# Altium footprint library Lib_001.PcbLib: 429 footprints (part 7 of 28)
Each footprint in its own frame and in the unit in brackets; x right, y up, seen from the top. Pads: shape width x height; smd on the part's side, far side on the other; paste and mask are expansions set on the pad; w line width, h text height; cw(c..) or ccw(c..) is an arc to the next point about the centre after c.
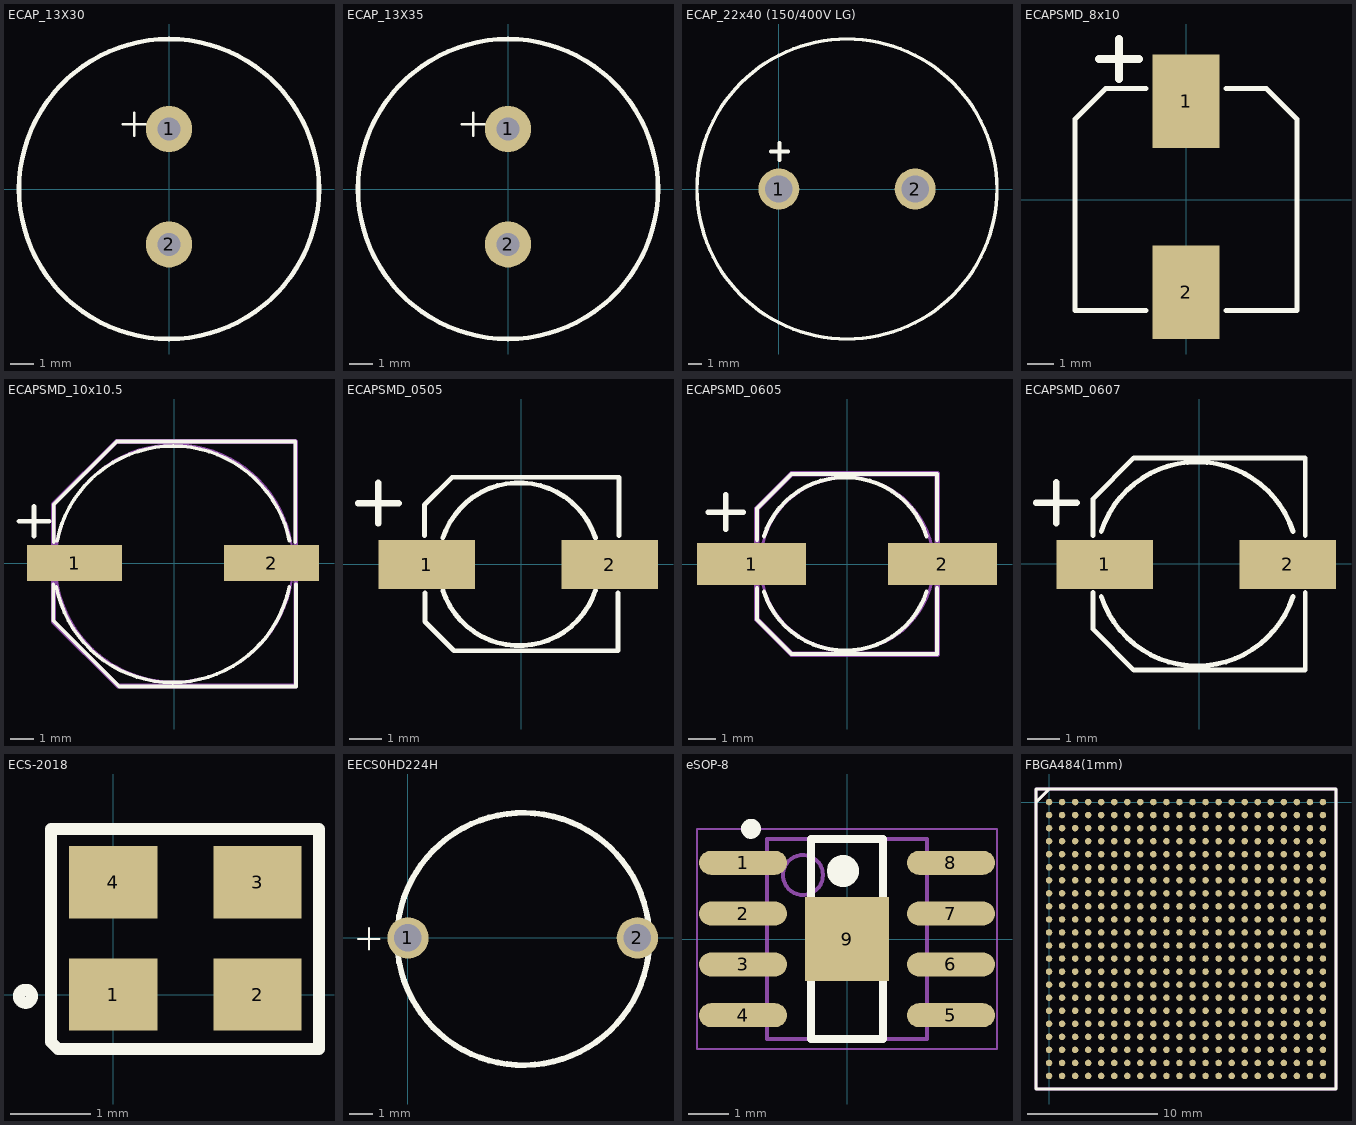
[diagram p6: the footprints below, top view; thin cyan lines are the x and y axes]

## ECAP_13X30 [mm]
height 11
pads (2):
  round 2 hole 1: 1(0,2.6) 2(0,-2.4)
Top Overlay:
  circle w0.2: c0,0 r6.5
  lines w0.1: -2,2.8 -1,2.8 ; -1.5,2.3 -1.5,3.3
3D body "User Library-Cap electrolitic radial 13x31.STEP": height 31.8, standoff -0.7, extent -6.482,-6.438 6.499,6.558

## ECAP_13X35 [mm]
height 11
pads (2):
  round 2 hole 1: 1(0,2.6) 2(0,-2.4)
Top Overlay:
  circle w0.2: c0,0 r6.5
  lines w0.1: -2,2.8 -1,2.8 ; -1.5,2.3 -1.5,3.3
3D body "User Library-Cap electrolitic radial 13x35.STEP": height 35.8, standoff -0.7, extent -6.481,-6.498 6.5,6.498

## ECAP_22x40 (150/400V LG) [mm]
pads (2):
  round 3 hole 2: 1(0,0) 2(10,0)
Top Overlay:
  circle w0.254: c5,0 r11
  lines w0.3: -0.57,2.74 0.68,2.74 ; 0.055,2.115 0.055,3.365
3D body "User Library-Cap electrolitic radial 22x40.STEP": height 40.8, standoff -0.7, extent -5.986,-10.92 16.006,11.058

## ECAPSMD_8x10 [mm] "Aluminium Electrolytic Capacitor"
height 10
pads (2):
  rect 2.5x3.5 smd: 1(0.001,3.674) 2(0.001,-3.464)
Top Overlay:
  lines w0.2: -1.5,-4.15 -4.15,-4.15 -4.15,3 -3,4.15 -1.5,4.15 ; 1.5,-4.15 4.15,-4.15 4.15,3 3,4.15 1.5,4.15
  lines w0.3: -3.25,5.25 -1.75,5.25 ; -2.5,4.5 -2.5,6
3D body "User Library-AL_EL_cap_8mmx10mm.STEP": height 10.3, standoff -0.2, extent -4.34,-4.798 4.16,4.902

## ECAPSMD_10x10.5 [mm]
pads (2):
  rect 4x1.524 smd: 1(-4.2,0) 2(4.1,0)
Top Overlay:
  lines w0.152: -5.09,-0.889 -5.09,-2.43 -2.32,-5.2 5.13,-5.2 5.13,-0.889 ; -5.07,0.889 -5.07,2.47 -2.42,5.12 5.1,5.12 5.1,0.889 ; -4.971,-0.992 ccw(c-0.064,-0.033) 4.841,-1.004 ; -4.938,0.934 cw(c-0.04,-0.07) 4.857,0.939
  lines w0.2: -6.54,1.76 -5.27,1.76 ; -5.905,1.125 -5.905,2.395
Mechanical 1:
  circle w0.102: c0,0 r5
  lines w0.2: -5.09,-2.47 -5.09,2.47 -2.44,5.12 5.12,5.12 5.12,-5.18 -2.38,-5.18 -5.09,-2.47
3D body "User Library-cap_10x10x10-1.STEP": height 10.6, standoff 0.1, extent -5.89,-5.28 5.91,5.22

## ECAPSMD_0505 [mm]
pads (2):
  rect 3x1.524 smd: 1(-2.94,-0.01) 2(2.76,-0.01)
Top Overlay:
  lines w0.152: -3.01,0.889 -3.01,1.85 -2.15,2.71 3.04,2.71 3.04,0.889 ; -3,-0.889 -3,-1.78 -2.09,-2.69 3.02,-2.69 3.02,-0.889 ; -2.44,0.817 cw(c-0.064,0.041) 2.313,0.817 ; -2.438,-0.815 ccw(c-0.064,-0.033) 2.311,-0.815
  lines w0.2: -5.08,1.905 -3.81,1.905 ; -4.445,1.27 -4.445,2.54
3D body "User Library-CAP SMD SVP 5_0x5_9.STEP": height 5.9, standoff 0, extent -2.99,-2.66 3.01,2.64

## ECAPSMD_0605 [mm]
pads (2):
  rect 4x1.524 smd: 1(-3.5,0) 2(3.5,0)
Top Overlay:
  lines w0.152: -3.302,-0.889 -3.302,-2.032 -2.032,-3.302 3.302,-3.302 3.302,-0.889 ; -3.302,0.889 -3.302,2.032 -2.032,3.302 3.302,3.302 3.302,0.889 ; -3.048,-1.016 ccw(c-0.064,-0.033) 2.921,-1.016 ; -3.048,1.016 cw(c-0.064,0.041) 2.921,1.016
  lines w0.2: -5.08,1.905 -3.81,1.905 ; -4.445,1.27 -4.445,2.54
Mechanical 1:
  circle w0.102: c0,0 r3.175
  lines w0.102: -3.302,-0.381 -3.683,-0.381 -3.683,0.381 -3.302,0.381 ; 3.302,-0.381 3.683,-0.381 3.683,0.381 3.302,0.381
  lines w0.203: -3.302,-2.032 -3.302,2.032 -2.032,3.302 3.302,3.302 3.302,-3.302 -2.032,-3.302 -3.302,-2.032
3D body "User Library-capasitores electroliticos.step": height -0.5, standoff -6.05, extent -3.29,-3.43 3.31,3.17

## ECAPSMD_0607 [mm]
pads (2):
  rect 3x1.524 smd: 1(-2.94,-0.01) 2(2.76,-0.01)
Top Overlay:
  lines w0.152: -3.302,-0.89 -3.302,-2.033 -2.032,-3.303 3.302,-3.303 3.302,-0.89 ; -3.302,0.888 -3.302,2.031 -2.032,3.301 3.302,3.301 3.302,0.888 ; -3.048,-1.017 ccw(c-0.064,-0.034) 2.921,-1.017 ; -3.048,1.015 cw(c-0.064,0.04) 2.921,1.015
  lines w0.2: -5.08,1.904 -3.81,1.904 ; -4.445,1.269 -4.445,2.539
3D body "User Library-CC0607.step": height 8.11, standoff 0, extent -3.51,-3.35 3.49,3.25

## ECS-2018 [mm]
pads (4):
  rect 1.1x0.9 smd: 1(0,0) 2(1.8,0) 3(1.8,1.4) 4(0,1.4)
Top Overlay:
  circle w0.15: c-1.093,-0.021 r0.081
  lines w0.15: -0.777,-0.589 -0.777,2.066 2.566,2.066 2.566,-0.68 -0.686,-0.68 -0.777,-0.589
3D body "ECS-2018-120-BN.stp": height 1, standoff 0, extent -0.456,-0.348 2.264,1.772

## EECS0HD224H [mm] "ионистор"
pads (2):
  round 1.8 hole 1.2: 1(0,0) 2(10,0)
Top Overlay:
  circle w0.254: c5.025,-0.05 r5.5
  lines w0.1: -2.175,-0.05 -1.25,-0.05 ; -1.7,-0.5 -1.7,0.425
3D body "User Library-eecs0hd224h.STEP": height 5.42, standoff -1.07, extent -0.425,-5.3 10.536,5.2

## eSOP-8 [mm] "SOIC, 8-Leads, Body 4.9x3.9mm, Pitch 1.27mm, IPC Medium Density"
height 1.75
pads (9):
  oval 2.2x0.6 smd: 1(-2.6,1.905) 2(-2.6,0.635) 3(-2.6,-0.635) 4(-2.6,-1.905) 5(2.6,-1.905) 6(2.6,-0.635) 7(2.6,0.635) 8(2.6,1.905)
  rect 2.09x2.09 smd: 9(0,0)
Top Overlay:
  circle w0.25: c-2.4,2.755 r0.125
  circle w0.4: c-0.1,1.7 r0.2
  lines w0.2: -0.9,-2.5 -0.9,2.5 0.9,2.5 0.9,-2.5 -0.9,-2.5
Mechanical 13:
  circle w0.1: c-1.1,1.6 r0.5
  lines w0.1: -2,-2.5 -2,2.5 2,2.5 2,-2.5 -2,-2.5
Mechanical 15:
  lines w0.05: -3.75,-2.75 -3.75,2.75 3.75,2.75 3.75,-2.75 -3.75,-2.75
  lines w0.1: -0.5,0 0.5,0 ; 0,-0.5 0,0.5
3D body "User Library-SOIC-8-1.STEP": height 1.75, standoff 0, extent -2.981,-2.455 3.018,2.445

## FBGA484(1mm) [mm]
pads (484):
  round 0.5 smd: A1(0,0) A2(1,0) A3(2,0) A4(3,0) A5(4,0) A6(5,0) A7(6,0) A8(7,0) A9(8,0) A10(9,0) A11(10,0) A12(11,0) A13(12,0) A14(13,0) A15(14,0) A16(15,0) A17(16,0) A18(17,0) A19(18,0) A20(19,0) A21(20,0) A22(21,0) AA1(0,-20) AA2(1,-20) AA3(2,-20) AA4(3,-20) AA5(4,-20) AA6(5,-20) AA7(6,-20) AA8(7,-20) AA9(8,-20) AA10(9,-20) AA11(10,-20) AA12(11,-20) AA13(12,-20) AA14(13,-20) AA15(14,-20) AA16(15,-20) AA17(16,-20) AA18(17,-20) AA19(18,-20) AA20(19,-20) AA21(20,-20) AA22(21,-20) AB1(0,-21) AB2(1,-21) AB3(2,-21) AB4(3,-21) AB5(4,-21) AB6(5,-21) AB7(6,-21) AB8(7,-21) AB9(8,-21) AB10(9,-21) AB11(10,-21) AB12(11,-21) AB13(12,-21) AB14(13,-21) AB15(14,-21) AB16(15,-21) AB17(16,-21) AB18(17,-21) AB19(18,-21) AB20(19,-21) AB21(20,-21) AB22(21,-21) B1(0,-1) B2(1,-1) B3(2,-1) B4(3,-1) B5(4,-1) B6(5,-1) B7(6,-1) B8(7,-1) B9(8,-1) B10(9,-1) B11(10,-1) B12(11,-1) B13(12,-1) B14(13,-1) B15(14,-1) B16(15,-1) B17(16,-1) B18(17,-1) B19(18,-1) B20(19,-1) B21(20,-1) B22(21,-1) C1(0,-2) C2(1,-2) C3(2,-2) C4(3,-2) C5(4,-2) C6(5,-2) C7(6,-2) C8(7,-2) C9(8,-2) C10(9,-2) C11(10,-2) C12(11,-2) C13(12,-2) C14(13,-2) C15(14,-2) C16(15,-2) C17(16,-2) C18(17,-2) C19(18,-2) C20(19,-2) C21(20,-2) C22(21,-2) D1(0,-3) D2(1,-3) D3(2,-3) D4(3,-3) D5(4,-3) D6(5,-3) D7(6,-3) D8(7,-3) D9(8,-3) D10(9,-3) D11(10,-3) D12(11,-3) D13(12,-3) D14(13,-3) D15(14,-3) D16(15,-3) D17(16,-3) D18(17,-3) D19(18,-3) D20(19,-3) D21(20,-3) D22(21,-3) E1(0,-4) E2(1,-4) E3(2,-4) E4(3,-4) E5(4,-4) E6(5,-4) E7(6,-4) E8(7,-4) E9(8,-4) E10(9,-4) E11(10,-4) E12(11,-4) E13(12,-4) E14(13,-4) E15(14,-4) E16(15,-4) E17(16,-4) E18(17,-4) E19(18,-4) E20(19,-4) E21(20,-4) E22(21,-4) F1(0,-5) F2(1,-5) F3(2,-5) F4(3,-5) F5(4,-5) F6(5,-5) F7(6,-5) F8(7,-5) F9(8,-5) F10(9,-5) F11(10,-5) F12(11,-5) F13(12,-5) F14(13,-5) F15(14,-5) F16(15,-5) F17(16,-5) F18(17,-5) F19(18,-5) F20(19,-5) F21(20,-5) F22(21,-5) G1(0,-6) G2(1,-6) G3(2,-6) G4(3,-6) G5(4,-6) G6(5,-6) G7(6,-6) G8(7,-6) G9(8,-6) G10(9,-6) G11(10,-6) G12(11,-6) G13(12,-6) G14(13,-6) G15(14,-6) G16(15,-6) G17(16,-6) G18(17,-6) G19(18,-6) G20(19,-6) G21(20,-6) G22(21,-6) H1(0,-7) H2(1,-7) H3(2,-7) H4(3,-7) H5(4,-7) H6(5,-7) H7(6,-7) H8(7,-7) H9(8,-7) H10(9,-7) H11(10,-7) H12(11,-7) H13(12,-7) H14(13,-7) H15(14,-7) H16(15,-7) H17(16,-7) H18(17,-7) H19(18,-7) H20(19,-7) H21(20,-7) H22(21,-7) J1(0,-8) J2(1,-8) J3(2,-8) J4(3,-8) J5(4,-8) J6(5,-8) J7(6,-8) J8(7,-8) J9(8,-8) J10(9,-8) J11(10,-8) J12(11,-8) J13(12,-8) J14(13,-8) J15(14,-8) J16(15,-8) J17(16,-8) J18(17,-8) J19(18,-8) J20(19,-8) J21(20,-8) J22(21,-8) K1(0,-9) K2(1,-9) K3(2,-9) K4(3,-9) K5(4,-9) K6(5,-9) K7(6,-9) K8(7,-9) K9(8,-9) K10(9,-9) K11(10,-9) K12(11,-9) K13(12,-9) K14(13,-9) K15(14,-9) K16(15,-9) K17(16,-9) K18(17,-9) K19(18,-9) K20(19,-9) K21(20,-9) K22(21,-9) L1(0,-10) L2(1,-10) L3(2,-10) L4(3,-10) L5(4,-10) L6(5,-10) L7(6,-10) L8(7,-10) L9(8,-10) L10(9,-10) L11(10,-10) L12(11,-10) L13(12,-10) L14(13,-10) L15(14,-10) L16(15,-10) L17(16,-10) L18(17,-10) L19(18,-10) L20(19,-10) L21(20,-10) L22(21,-10) M1(0,-11) M2(1,-11) M3(2,-11) M4(3,-11) M5(4,-11) M6(5,-11) M7(6,-11) M8(7,-11) M9(8,-11) M10(9,-11) M11(10,-11) M12(11,-11) M13(12,-11) M14(13,-11) M15(14,-11) M16(15,-11) M17(16,-11) M18(17,-11) M19(18,-11) M20(19,-11) M21(20,-11) M22(21,-11) N1(0,-12) N2(1,-12) N3(2,-12) N4(3,-12) N5(4,-12) N6(5,-12) N7(6,-12) N8(7,-12) N9(8,-12) N10(9,-12) N11(10,-12) N12(11,-12) N13(12,-12) N14(13,-12) N15(14,-12) N16(15,-12) N17(16,-12) N18(17,-12) N19(18,-12) N20(19,-12) N21(20,-12) N22(21,-12) P1(0,-13) P2(1,-13) P3(2,-13) P4(3,-13) P5(4,-13) P6(5,-13) P7(6,-13) P8(7,-13) P9(8,-13) P10(9,-13) P11(10,-13) P12(11,-13) P13(12,-13) P14(13,-13) P15(14,-13) P16(15,-13) P17(16,-13) P18(17,-13) P19(18,-13) P20(19,-13) P21(20,-13) P22(21,-13) R1(0,-14) R2(1,-14) R3(2,-14) R4(3,-14) R5(4,-14) R6(5,-14) R7(6,-14) R8(7,-14) R9(8,-14) R10(9,-14) R11(10,-14) R12(11,-14) R13(12,-14) R14(13,-14) R15(14,-14) R16(15,-14) R17(16,-14) R18(17,-14) R19(18,-14) R20(19,-14) R21(20,-14) R22(21,-14) T1(0,-15) T2(1,-15) T3(2,-15) T4(3,-15) T5(4,-15) T6(5,-15) T7(6,-15) T8(7,-15) T9(8,-15) T10(9,-15) T11(10,-15) T12(11,-15) T13(12,-15) T14(13,-15) T15(14,-15) T16(15,-15) T17(16,-15) T18(17,-15) T19(18,-15) T20(19,-15) T21(20,-15) T22(21,-15) U1(0,-16) U2(1,-16) U3(2,-16) U4(3,-16) U5(4,-16) U6(5,-16) U7(6,-16) U8(7,-16) U9(8,-16) U10(9,-16) U11(10,-16) U12(11,-16) U13(12,-16) U14(13,-16) U15(14,-16) U16(15,-16) U17(16,-16) U18(17,-16) U19(18,-16) U20(19,-16) U21(20,-16) U22(21,-16) V1(0,-17) V2(1,-17) V3(2,-17) V4(3,-17) V5(4,-17) V6(5,-17) V7(6,-17) V8(7,-17) V9(8,-17) V10(9,-17) V11(10,-17) V12(11,-17) V13(12,-17) V14(13,-17) V15(14,-17) V16(15,-17) V17(16,-17) V18(17,-17) V19(18,-17) V20(19,-17) V21(20,-17) V22(21,-17) W1(0,-18) W2(1,-18) W3(2,-18) W4(3,-18) W5(4,-18) W6(5,-18) W7(6,-18) W8(7,-18) W9(8,-18) W10(9,-18) W11(10,-18) W12(11,-18) W13(12,-18) W14(13,-18) W15(14,-18) W16(15,-18) W17(16,-18) W18(17,-18) W19(18,-18) W20(19,-18) W21(20,-18) W22(21,-18) Y1(0,-19) Y2(1,-19) Y3(2,-19) Y4(3,-19) Y5(4,-19) Y6(5,-19) Y7(6,-19) Y8(7,-19) Y9(8,-19) Y10(9,-19) Y11(10,-19) Y12(11,-19) Y13(12,-19) Y14(13,-19) Y15(14,-19) Y16(15,-19) Y17(16,-19) Y18(17,-19) Y19(18,-19) Y20(19,-19) Y21(20,-19) Y22(21,-19)
Top Overlay:
  lines w0.254: -1,0 0,1 ; -1,-22 22,-22 22,1 -1,1 -1,-22
Mechanical 1:
  lines w0.254: -1,0 0,1 ; -1,-22 22,-22 22,1 -1,1 -1,-22
3D body: height 2.5, standoff 2.3, extent 23.4,-15.45 36.45,-1.6
3D body "FBGA484_Cyclone_III.STEP": height 2.15, standoff 0.4, extent -1,-22 22,1
3D body: height 0.45, standoff -0.05, extent 9.753,-11.249 10.25,-10.751
3D body: height 0.45, standoff -0.05, extent 8.753,-11.249 9.25,-10.751
3D body: height 0.45, standoff -0.05, extent 7.753,-11.249 8.25,-10.751
3D body: height 0.45, standoff -0.05, extent 6.753,-11.249 7.25,-10.751
3D body: height 0.45, standoff -0.05, extent 5.753,-11.249 6.25,-10.751
3D body: height 0.45, standoff -0.05, extent 4.753,-11.249 5.25,-10.751
3D body: height 0.45, standoff -0.05, extent 3.753,-11.249 4.25,-10.751
3D body: height 0.45, standoff -0.05, extent 2.753,-11.249 3.25,-10.751
3D body: height 0.45, standoff -0.05, extent 1.753,-11.249 2.25,-10.751
3D body: height 0.45, standoff -0.05, extent 0.753,-11.249 1.25,-10.751
3D body: height 0.45, standoff -0.05, extent -0.247,-11.249 0.25,-10.751
3D body: height 0.45, standoff -0.05, extent 10.753,-11.249 11.25,-10.751
3D body: height 0.45, standoff -0.05, extent 11.753,-11.249 12.25,-10.751
3D body: height 0.45, standoff -0.05, extent 12.753,-11.249 13.25,-10.751
3D body: height 0.45, standoff -0.05, extent 13.753,-11.249 14.25,-10.751
3D body: height 0.45, standoff -0.05, extent 14.753,-11.249 15.25,-10.751
3D body: height 0.45, standoff -0.05, extent 15.753,-11.249 16.25,-10.751
3D body: height 0.45, standoff -0.05, extent 16.753,-11.249 17.25,-10.751
3D body: height 0.45, standoff -0.05, extent 17.753,-11.249 18.25,-10.751
3D body: height 0.45, standoff -0.05, extent 18.753,-11.249 19.25,-10.751
3D body: height 0.45, standoff -0.05, extent 19.753,-11.249 20.25,-10.751
3D body: height 0.45, standoff -0.05, extent 20.753,-11.249 21.25,-10.751
3D body: height 0.45, standoff -0.05, extent 20.753,-12.249 21.25,-11.751
3D body: height 0.45, standoff -0.05, extent 19.753,-12.249 20.25,-11.751
3D body: height 0.45, standoff -0.05, extent 18.753,-12.249 19.25,-11.751
3D body: height 0.45, standoff -0.05, extent 17.753,-12.249 18.25,-11.751
3D body: height 0.45, standoff -0.05, extent 16.753,-12.249 17.25,-11.751
3D body: height 0.45, standoff -0.05, extent 15.753,-12.249 16.25,-11.751
3D body: height 0.45, standoff -0.05, extent 14.753,-12.249 15.25,-11.751
3D body: height 0.45, standoff -0.05, extent 13.753,-12.249 14.25,-11.751
3D body: height 0.45, standoff -0.05, extent 12.753,-12.249 13.25,-11.751
3D body: height 0.45, standoff -0.05, extent 11.753,-12.249 12.25,-11.751
3D body: height 0.45, standoff -0.05, extent 10.753,-12.249 11.25,-11.751
3D body: height 0.45, standoff -0.05, extent -0.247,-12.249 0.25,-11.751
3D body: height 0.45, standoff -0.05, extent 0.753,-12.249 1.25,-11.751
3D body: height 0.45, standoff -0.05, extent 1.753,-12.249 2.25,-11.751
3D body: height 0.45, standoff -0.05, extent 2.753,-12.249 3.25,-11.751
3D body: height 0.45, standoff -0.05, extent 3.753,-12.249 4.25,-11.751
3D body: height 0.45, standoff -0.05, extent 4.753,-12.249 5.25,-11.751
3D body: height 0.45, standoff -0.05, extent 5.753,-12.249 6.25,-11.751
3D body: height 0.45, standoff -0.05, extent 6.753,-12.249 7.25,-11.751
3D body: height 0.45, standoff -0.05, extent 7.753,-12.249 8.25,-11.751
3D body: height 0.45, standoff -0.05, extent 8.753,-12.249 9.25,-11.751
3D body: height 0.45, standoff -0.05, extent 9.753,-12.249 10.25,-11.751
3D body: height 0.45, standoff -0.05, extent 20.753,-13.249 21.25,-12.751
3D body: height 0.45, standoff -0.05, extent 19.753,-13.249 20.25,-12.751
3D body: height 0.45, standoff -0.05, extent 18.753,-13.249 19.25,-12.751
3D body: height 0.45, standoff -0.05, extent 17.753,-13.249 18.25,-12.751
3D body: height 0.45, standoff -0.05, extent 16.753,-13.249 17.25,-12.751
3D body: height 0.45, standoff -0.05, extent 15.753,-13.249 16.25,-12.751
3D body: height 0.45, standoff -0.05, extent 14.753,-13.249 15.25,-12.751
3D body: height 0.45, standoff -0.05, extent 13.753,-13.249 14.25,-12.751
3D body: height 0.45, standoff -0.05, extent 12.753,-13.249 13.25,-12.751
3D body: height 0.45, standoff -0.05, extent 11.753,-13.249 12.25,-12.751
3D body: height 0.45, standoff -0.05, extent 10.753,-13.249 11.25,-12.751
3D body: height 0.45, standoff -0.05, extent -0.247,-13.249 0.25,-12.751
3D body: height 0.45, standoff -0.05, extent 0.753,-13.249 1.25,-12.751
3D body: height 0.45, standoff -0.05, extent 1.753,-13.249 2.25,-12.751
3D body: height 0.45, standoff -0.05, extent 2.753,-13.249 3.25,-12.751
3D body: height 0.45, standoff -0.05, extent 3.753,-13.249 4.25,-12.751
3D body: height 0.45, standoff -0.05, extent 4.753,-13.249 5.25,-12.751
3D body: height 0.45, standoff -0.05, extent 5.753,-13.249 6.25,-12.751
3D body: height 0.45, standoff -0.05, extent 6.753,-13.249 7.25,-12.751
3D body: height 0.45, standoff -0.05, extent 7.753,-13.249 8.25,-12.751
3D body: height 0.45, standoff -0.05, extent 8.753,-13.249 9.25,-12.751
3D body: height 0.45, standoff -0.05, extent 9.753,-13.249 10.25,-12.751
3D body: height 0.45, standoff -0.05, extent 20.753,-14.249 21.25,-13.751
3D body: height 0.45, standoff -0.05, extent 19.753,-14.249 20.25,-13.751
3D body: height 0.45, standoff -0.05, extent 18.753,-14.249 19.25,-13.751
3D body: height 0.45, standoff -0.05, extent 17.753,-14.249 18.25,-13.751
3D body: height 0.45, standoff -0.05, extent 16.753,-14.249 17.25,-13.751
3D body: height 0.45, standoff -0.05, extent 15.753,-14.249 16.25,-13.751
3D body: height 0.45, standoff -0.05, extent 14.753,-14.249 15.25,-13.751
3D body: height 0.45, standoff -0.05, extent 13.753,-14.249 14.25,-13.751
3D body: height 0.45, standoff -0.05, extent 12.753,-14.249 13.25,-13.751
3D body: height 0.45, standoff -0.05, extent 11.753,-14.249 12.25,-13.751
3D body: height 0.45, standoff -0.05, extent 10.753,-14.249 11.25,-13.751
3D body: height 0.45, standoff -0.05, extent -0.247,-14.249 0.25,-13.751
3D body: height 0.45, standoff -0.05, extent 0.753,-14.249 1.25,-13.751
3D body: height 0.45, standoff -0.05, extent 1.753,-14.249 2.25,-13.751
3D body: height 0.45, standoff -0.05, extent 2.753,-14.249 3.25,-13.751
3D body: height 0.45, standoff -0.05, extent 3.753,-14.249 4.25,-13.751
3D body: height 0.45, standoff -0.05, extent 4.753,-14.249 5.25,-13.751
3D body: height 0.45, standoff -0.05, extent 5.753,-14.249 6.25,-13.751
3D body: height 0.45, standoff -0.05, extent 6.753,-14.249 7.25,-13.751
3D body: height 0.45, standoff -0.05, extent 7.753,-14.249 8.25,-13.751
3D body: height 0.45, standoff -0.05, extent 8.753,-14.249 9.25,-13.751
3D body: height 0.45, standoff -0.05, extent 9.753,-14.249 10.25,-13.751
3D body: height 0.45, standoff -0.05, extent 20.753,-15.249 21.25,-14.751
3D body: height 0.45, standoff -0.05, extent 19.753,-15.249 20.25,-14.751
3D body: height 0.45, standoff -0.05, extent 18.753,-15.249 19.25,-14.751
3D body: height 0.45, standoff -0.05, extent 17.753,-15.249 18.25,-14.751
3D body: height 0.45, standoff -0.05, extent 16.753,-15.249 17.25,-14.751
3D body: height 0.45, standoff -0.05, extent 15.753,-15.249 16.25,-14.751
3D body: height 0.45, standoff -0.05, extent 14.753,-15.249 15.25,-14.751
3D body: height 0.45, standoff -0.05, extent 13.753,-15.249 14.25,-14.751
3D body: height 0.45, standoff -0.05, extent 12.753,-15.249 13.25,-14.751
3D body: height 0.45, standoff -0.05, extent 11.753,-15.249 12.25,-14.751
3D body: height 0.45, standoff -0.05, extent 10.753,-15.249 11.25,-14.751
3D body: height 0.45, standoff -0.05, extent -0.247,-15.249 0.25,-14.751
3D body: height 0.45, standoff -0.05, extent 0.753,-15.249 1.25,-14.751
3D body: height 0.45, standoff -0.05, extent 1.753,-15.249 2.25,-14.751
3D body: height 0.45, standoff -0.05, extent 2.753,-15.249 3.25,-14.751
3D body: height 0.45, standoff -0.05, extent 3.753,-15.249 4.25,-14.751
3D body: height 0.45, standoff -0.05, extent 4.753,-15.249 5.25,-14.751
3D body: height 0.45, standoff -0.05, extent 5.753,-15.249 6.25,-14.751
3D body: height 0.45, standoff -0.05, extent 6.753,-15.249 7.25,-14.751
3D body: height 0.45, standoff -0.05, extent 7.753,-15.249 8.25,-14.751
3D body: height 0.45, standoff -0.05, extent 8.753,-15.249 9.25,-14.751
3D body: height 0.45, standoff -0.05, extent 9.753,-15.249 10.25,-14.751
3D body: height 0.45, standoff -0.05, extent 20.753,-16.249 21.25,-15.751
3D body: height 0.45, standoff -0.05, extent 19.753,-16.249 20.25,-15.751
3D body: height 0.45, standoff -0.05, extent 18.753,-16.249 19.25,-15.751
3D body: height 0.45, standoff -0.05, extent 17.753,-16.249 18.25,-15.751
3D body: height 0.45, standoff -0.05, extent 16.753,-16.249 17.25,-15.751
3D body: height 0.45, standoff -0.05, extent 15.753,-16.249 16.25,-15.751
3D body: height 0.45, standoff -0.05, extent 14.753,-16.249 15.25,-15.751
3D body: height 0.45, standoff -0.05, extent 13.753,-16.249 14.25,-15.751
3D body: height 0.45, standoff -0.05, extent 12.753,-16.249 13.25,-15.751
3D body: height 0.45, standoff -0.05, extent 11.753,-16.249 12.25,-15.751
3D body: height 0.45, standoff -0.05, extent 10.753,-16.249 11.25,-15.751
3D body: height 0.45, standoff -0.05, extent -0.247,-16.249 0.25,-15.751
3D body: height 0.45, standoff -0.05, extent 0.753,-16.249 1.25,-15.751
3D body: height 0.45, standoff -0.05, extent 1.753,-16.249 2.25,-15.751
3D body: height 0.45, standoff -0.05, extent 2.753,-16.249 3.25,-15.751
3D body: height 0.45, standoff -0.05, extent 3.753,-16.249 4.25,-15.751
3D body: height 0.45, standoff -0.05, extent 4.753,-16.249 5.25,-15.751
3D body: height 0.45, standoff -0.05, extent 5.753,-16.249 6.25,-15.751
3D body: height 0.45, standoff -0.05, extent 6.753,-16.249 7.25,-15.751
3D body: height 0.45, standoff -0.05, extent 7.753,-16.249 8.25,-15.751
3D body: height 0.45, standoff -0.05, extent 8.753,-16.249 9.25,-15.751
3D body: height 0.45, standoff -0.05, extent 9.753,-16.249 10.25,-15.751
3D body: height 0.45, standoff -0.05, extent 20.753,-17.249 21.25,-16.751
3D body: height 0.45, standoff -0.05, extent 19.753,-17.249 20.25,-16.751
3D body: height 0.45, standoff -0.05, extent 18.753,-17.249 19.25,-16.751
3D body: height 0.45, standoff -0.05, extent 17.753,-17.249 18.25,-16.751
3D body: height 0.45, standoff -0.05, extent 16.753,-17.249 17.25,-16.751
3D body: height 0.45, standoff -0.05, extent 15.753,-17.249 16.25,-16.751
3D body: height 0.45, standoff -0.05, extent 14.753,-17.249 15.25,-16.751
3D body: height 0.45, standoff -0.05, extent 13.753,-17.249 14.25,-16.751
3D body: height 0.45, standoff -0.05, extent 12.753,-17.249 13.25,-16.751
3D body: height 0.45, standoff -0.05, extent 11.753,-17.249 12.25,-16.751
3D body: height 0.45, standoff -0.05, extent 10.753,-17.249 11.25,-16.751
3D body: height 0.45, standoff -0.05, extent -0.247,-17.249 0.25,-16.751
3D body: height 0.45, standoff -0.05, extent 0.753,-17.249 1.25,-16.751
3D body: height 0.45, standoff -0.05, extent 1.753,-17.249 2.25,-16.751
3D body: height 0.45, standoff -0.05, extent 2.753,-17.249 3.25,-16.751
3D body: height 0.45, standoff -0.05, extent 3.753,-17.249 4.25,-16.751
3D body: height 0.45, standoff -0.05, extent 4.753,-17.249 5.25,-16.751
3D body: height 0.45, standoff -0.05, extent 5.753,-17.249 6.25,-16.751
3D body: height 0.45, standoff -0.05, extent 6.753,-17.249 7.25,-16.751
3D body: height 0.45, standoff -0.05, extent 7.753,-17.249 8.25,-16.751
3D body: height 0.45, standoff -0.05, extent 8.753,-17.249 9.25,-16.751
3D body: height 0.45, standoff -0.05, extent 9.753,-17.249 10.25,-16.751
3D body: height 0.45, standoff -0.05, extent 20.753,-18.249 21.25,-17.751
3D body: height 0.45, standoff -0.05, extent 19.753,-18.249 20.25,-17.751
3D body: height 0.45, standoff -0.05, extent 18.753,-18.249 19.25,-17.751
3D body: height 0.45, standoff -0.05, extent 17.753,-18.249 18.25,-17.751
3D body: height 0.45, standoff -0.05, extent 16.753,-18.249 17.25,-17.751
3D body: height 0.45, standoff -0.05, extent 15.753,-18.249 16.25,-17.751
3D body: height 0.45, standoff -0.05, extent 14.753,-18.249 15.25,-17.751
3D body: height 0.45, standoff -0.05, extent 13.753,-18.249 14.25,-17.751
3D body: height 0.45, standoff -0.05, extent 12.753,-18.249 13.25,-17.751
3D body: height 0.45, standoff -0.05, extent 11.753,-18.249 12.25,-17.751
3D body: height 0.45, standoff -0.05, extent 10.753,-18.249 11.25,-17.751
3D body: height 0.45, standoff -0.05, extent -0.247,-18.249 0.25,-17.751
3D body: height 0.45, standoff -0.05, extent 0.753,-18.249 1.25,-17.751
3D body: height 0.45, standoff -0.05, extent 1.753,-18.249 2.25,-17.751
3D body: height 0.45, standoff -0.05, extent 2.753,-18.249 3.25,-17.751
3D body: height 0.45, standoff -0.05, extent 3.753,-18.249 4.25,-17.751
3D body: height 0.45, standoff -0.05, extent 4.753,-18.249 5.25,-17.751
3D body: height 0.45, standoff -0.05, extent 5.753,-18.249 6.25,-17.751
3D body: height 0.45, standoff -0.05, extent 6.753,-18.249 7.25,-17.751
3D body: height 0.45, standoff -0.05, extent 7.753,-18.249 8.25,-17.751
3D body: height 0.45, standoff -0.05, extent 8.753,-18.249 9.25,-17.751
3D body: height 0.45, standoff -0.05, extent 9.753,-18.249 10.25,-17.751
3D body: height 0.45, standoff -0.05, extent 20.753,-19.249 21.25,-18.751
3D body: height 0.45, standoff -0.05, extent 19.753,-19.249 20.25,-18.751
3D body: height 0.45, standoff -0.05, extent 18.753,-19.249 19.25,-18.751
3D body: height 0.45, standoff -0.05, extent 17.753,-19.249 18.25,-18.751
3D body: height 0.45, standoff -0.05, extent 16.753,-19.249 17.25,-18.751
3D body: height 0.45, standoff -0.05, extent 15.753,-19.249 16.25,-18.751
3D body: height 0.45, standoff -0.05, extent 14.753,-19.249 15.25,-18.751
3D body: height 0.45, standoff -0.05, extent 13.753,-19.249 14.25,-18.751
3D body: height 0.45, standoff -0.05, extent 12.753,-19.249 13.25,-18.751
3D body: height 0.45, standoff -0.05, extent 11.753,-19.249 12.25,-18.751
3D body: height 0.45, standoff -0.05, extent 10.753,-19.249 11.25,-18.751
3D body: height 0.45, standoff -0.05, extent -0.247,-19.249 0.25,-18.751
3D body: height 0.45, standoff -0.05, extent 0.753,-19.249 1.25,-18.751
3D body: height 0.45, standoff -0.05, extent 1.753,-19.249 2.25,-18.751
3D body: height 0.45, standoff -0.05, extent 2.753,-19.249 3.25,-18.751
3D body: height 0.45, standoff -0.05, extent 3.753,-19.249 4.25,-18.751
3D body: height 0.45, standoff -0.05, extent 4.753,-19.249 5.25,-18.751
3D body: height 0.45, standoff -0.05, extent 5.753,-19.249 6.25,-18.751
3D body: height 0.45, standoff -0.05, extent 6.753,-19.249 7.25,-18.751
3D body: height 0.45, standoff -0.05, extent 7.753,-19.249 8.25,-18.751
3D body: height 0.45, standoff -0.05, extent 8.753,-19.249 9.25,-18.751
3D body: height 0.45, standoff -0.05, extent 9.753,-19.249 10.25,-18.751
3D body: height 0.45, standoff -0.05, extent 20.753,-20.249 21.25,-19.751
3D body: height 0.45, standoff -0.05, extent 19.753,-20.249 20.25,-19.751
3D body: height 0.45, standoff -0.05, extent 18.753,-20.249 19.25,-19.751
3D body: height 0.45, standoff -0.05, extent 17.753,-20.249 18.25,-19.751
3D body: height 0.45, standoff -0.05, extent 16.753,-20.249 17.25,-19.751
3D body: height 0.45, standoff -0.05, extent 15.753,-20.249 16.25,-19.751
3D body: height 0.45, standoff -0.05, extent 14.753,-20.249 15.25,-19.751
3D body: height 0.45, standoff -0.05, extent 13.753,-20.249 14.25,-19.751
3D body: height 0.45, standoff -0.05, extent 12.753,-20.249 13.25,-19.751
3D body: height 0.45, standoff -0.05, extent 11.753,-20.249 12.25,-19.751
3D body: height 0.45, standoff -0.05, extent 10.753,-20.249 11.25,-19.751
3D body: height 0.45, standoff -0.05, extent -0.247,-20.249 0.25,-19.751
3D body: height 0.45, standoff -0.05, extent 0.753,-20.249 1.25,-19.751
3D body: height 0.45, standoff -0.05, extent 1.753,-20.249 2.25,-19.751
3D body: height 0.45, standoff -0.05, extent 2.753,-20.249 3.25,-19.751
3D body: height 0.45, standoff -0.05, extent 3.753,-20.249 4.25,-19.751
3D body: height 0.45, standoff -0.05, extent 4.753,-20.249 5.25,-19.751
3D body: height 0.45, standoff -0.05, extent 5.753,-20.249 6.25,-19.751
3D body: height 0.45, standoff -0.05, extent 6.753,-20.249 7.25,-19.751
3D body: height 0.45, standoff -0.05, extent 7.753,-20.249 8.25,-19.751
3D body: height 0.45, standoff -0.05, extent 8.753,-20.249 9.25,-19.751
3D body: height 0.45, standoff -0.05, extent 9.753,-20.249 10.25,-19.751
3D body: height 0.45, standoff -0.05, extent 20.753,-21.249 21.25,-20.751
3D body: height 0.45, standoff -0.05, extent 19.753,-21.249 20.25,-20.751
3D body: height 0.45, standoff -0.05, extent 18.753,-21.249 19.25,-20.751
3D body: height 0.45, standoff -0.05, extent 17.753,-21.249 18.25,-20.751
3D body: height 0.45, standoff -0.05, extent 16.753,-21.249 17.25,-20.751
3D body: height 0.45, standoff -0.05, extent 15.753,-21.249 16.25,-20.751
3D body: height 0.45, standoff -0.05, extent 14.753,-21.249 15.25,-20.751
3D body: height 0.45, standoff -0.05, extent 13.753,-21.249 14.25,-20.751
3D body: height 0.45, standoff -0.05, extent 12.753,-21.249 13.25,-20.751
3D body: height 0.45, standoff -0.05, extent 11.753,-21.249 12.25,-20.751
3D body: height 0.45, standoff -0.05, extent 10.753,-21.249 11.25,-20.751
3D body: height 0.45, standoff -0.05, extent -0.247,-21.249 0.25,-20.751
3D body: height 0.45, standoff -0.05, extent 0.753,-21.249 1.25,-20.751
3D body: height 0.45, standoff -0.05, extent 1.753,-21.249 2.25,-20.751
3D body: height 0.45, standoff -0.05, extent 2.753,-21.249 3.25,-20.751
3D body: height 0.45, standoff -0.05, extent 3.753,-21.249 4.25,-20.751
3D body: height 0.45, standoff -0.05, extent 4.753,-21.249 5.25,-20.751
3D body: height 0.45, standoff -0.05, extent 5.753,-21.249 6.25,-20.751
3D body: height 0.45, standoff -0.05, extent 6.753,-21.249 7.25,-20.751
3D body: height 0.45, standoff -0.05, extent 7.753,-21.249 8.25,-20.751
3D body: height 0.45, standoff -0.05, extent 8.753,-21.249 9.25,-20.751
3D body: height 0.45, standoff -0.05, extent 9.753,-21.249 10.25,-20.751
3D body: height 0.45, standoff -0.05, extent 9.753,-10.249 10.25,-9.751
3D body: height 0.45, standoff -0.05, extent 8.753,-10.249 9.25,-9.751
3D body: height 0.45, standoff -0.05, extent 7.753,-10.249 8.25,-9.751
3D body: height 0.45, standoff -0.05, extent 6.753,-10.249 7.25,-9.751
3D body: height 0.45, standoff -0.05, extent 5.753,-10.249 6.25,-9.751
3D body: height 0.45, standoff -0.05, extent 4.753,-10.249 5.25,-9.751
3D body: height 0.45, standoff -0.05, extent 3.753,-10.249 4.25,-9.751
3D body: height 0.45, standoff -0.05, extent 2.753,-10.249 3.25,-9.751
3D body: height 0.45, standoff -0.05, extent 1.753,-10.249 2.25,-9.751
3D body: height 0.45, standoff -0.05, extent 0.753,-10.249 1.25,-9.751
3D body: height 0.45, standoff -0.05, extent -0.247,-10.249 0.25,-9.751
3D body: height 0.45, standoff -0.05, extent 10.753,-10.249 11.25,-9.751
3D body: height 0.45, standoff -0.05, extent 11.753,-10.249 12.25,-9.751
3D body: height 0.45, standoff -0.05, extent 12.753,-10.249 13.25,-9.751
3D body: height 0.45, standoff -0.05, extent 13.753,-10.249 14.25,-9.751
3D body: height 0.45, standoff -0.05, extent 14.753,-10.249 15.25,-9.751
3D body: height 0.45, standoff -0.05, extent 15.753,-10.249 16.25,-9.751
3D body: height 0.45, standoff -0.05, extent 16.753,-10.249 17.25,-9.751
3D body: height 0.45, standoff -0.05, extent 17.753,-10.249 18.25,-9.751
3D body: height 0.45, standoff -0.05, extent 18.753,-10.249 19.25,-9.751
3D body: height 0.45, standoff -0.05, extent 19.753,-10.249 20.25,-9.751
3D body: height 0.45, standoff -0.05, extent 20.753,-10.249 21.25,-9.751
3D body: height 0.45, standoff -0.05, extent 9.753,-9.249 10.25,-8.751
3D body: height 0.45, standoff -0.05, extent 8.753,-9.249 9.25,-8.751
3D body: height 0.45, standoff -0.05, extent 7.753,-9.249 8.25,-8.751
3D body: height 0.45, standoff -0.05, extent 6.753,-9.249 7.25,-8.751
3D body: height 0.45, standoff -0.05, extent 5.753,-9.249 6.25,-8.751
3D body: height 0.45, standoff -0.05, extent 4.753,-9.249 5.25,-8.751
3D body: height 0.45, standoff -0.05, extent 3.753,-9.249 4.25,-8.751
3D body: height 0.45, standoff -0.05, extent 2.753,-9.249 3.25,-8.751
3D body: height 0.45, standoff -0.05, extent 1.753,-9.249 2.25,-8.751
3D body: height 0.45, standoff -0.05, extent 0.753,-9.249 1.25,-8.751
3D body: height 0.45, standoff -0.05, extent -0.247,-9.249 0.25,-8.751
3D body: height 0.45, standoff -0.05, extent 10.753,-9.249 11.25,-8.751
3D body: height 0.45, standoff -0.05, extent 11.753,-9.249 12.25,-8.751
3D body: height 0.45, standoff -0.05, extent 12.753,-9.249 13.25,-8.751
3D body: height 0.45, standoff -0.05, extent 13.753,-9.249 14.25,-8.751
3D body: height 0.45, standoff -0.05, extent 14.753,-9.249 15.25,-8.751
3D body: height 0.45, standoff -0.05, extent 15.753,-9.249 16.25,-8.751
3D body: height 0.45, standoff -0.05, extent 16.753,-9.249 17.25,-8.751
3D body: height 0.45, standoff -0.05, extent 17.753,-9.249 18.25,-8.751
3D body: height 0.45, standoff -0.05, extent 18.753,-9.249 19.25,-8.751
3D body: height 0.45, standoff -0.05, extent 19.753,-9.249 20.25,-8.751
3D body: height 0.45, standoff -0.05, extent 20.753,-9.249 21.25,-8.751
3D body: height 0.45, standoff -0.05, extent 9.753,-8.249 10.25,-7.751
3D body: height 0.45, standoff -0.05, extent 8.753,-8.249 9.25,-7.751
3D body: height 0.45, standoff -0.05, extent 7.753,-8.249 8.25,-7.751
3D body: height 0.45, standoff -0.05, extent 6.753,-8.249 7.25,-7.751
3D body: height 0.45, standoff -0.05, extent 5.753,-8.249 6.25,-7.751
3D body: height 0.45, standoff -0.05, extent 4.753,-8.249 5.25,-7.751
3D body: height 0.45, standoff -0.05, extent 3.753,-8.249 4.25,-7.751
3D body: height 0.45, standoff -0.05, extent 2.753,-8.249 3.25,-7.751
3D body: height 0.45, standoff -0.05, extent 1.753,-8.249 2.25,-7.751
3D body: height 0.45, standoff -0.05, extent 0.753,-8.249 1.25,-7.751
3D body: height 0.45, standoff -0.05, extent -0.247,-8.249 0.25,-7.751
3D body: height 0.45, standoff -0.05, extent 10.753,-8.249 11.25,-7.751
3D body: height 0.45, standoff -0.05, extent 11.753,-8.249 12.25,-7.751
3D body: height 0.45, standoff -0.05, extent 12.753,-8.249 13.25,-7.751
3D body: height 0.45, standoff -0.05, extent 13.753,-8.249 14.25,-7.751
3D body: height 0.45, standoff -0.05, extent 14.753,-8.249 15.25,-7.751
3D body: height 0.45, standoff -0.05, extent 15.753,-8.249 16.25,-7.751
3D body: height 0.45, standoff -0.05, extent 16.753,-8.249 17.25,-7.751
3D body: height 0.45, standoff -0.05, extent 17.753,-8.249 18.25,-7.751
3D body: height 0.45, standoff -0.05, extent 18.753,-8.249 19.25,-7.751
3D body: height 0.45, standoff -0.05, extent 19.753,-8.249 20.25,-7.751
3D body: height 0.45, standoff -0.05, extent 20.753,-8.249 21.25,-7.751
3D body: height 0.45, standoff -0.05, extent 9.753,-7.249 10.25,-6.751
3D body: height 0.45, standoff -0.05, extent 8.753,-7.249 9.25,-6.751
3D body: height 0.45, standoff -0.05, extent 7.753,-7.249 8.25,-6.751
3D body: height 0.45, standoff -0.05, extent 6.753,-7.249 7.25,-6.751
3D body: height 0.45, standoff -0.05, extent 5.753,-7.249 6.25,-6.751
3D body: height 0.45, standoff -0.05, extent 4.753,-7.249 5.25,-6.751
3D body: height 0.45, standoff -0.05, extent 3.753,-7.249 4.25,-6.751
3D body: height 0.45, standoff -0.05, extent 2.753,-7.249 3.25,-6.751
3D body: height 0.45, standoff -0.05, extent 1.753,-7.249 2.25,-6.751
3D body: height 0.45, standoff -0.05, extent 0.753,-7.249 1.25,-6.751
3D body: height 0.45, standoff -0.05, extent -0.247,-7.249 0.25,-6.751
3D body: height 0.45, standoff -0.05, extent 10.753,-7.249 11.25,-6.751
3D body: height 0.45, standoff -0.05, extent 11.753,-7.249 12.25,-6.751
3D body: height 0.45, standoff -0.05, extent 12.753,-7.249 13.25,-6.751
3D body: height 0.45, standoff -0.05, extent 13.753,-7.249 14.25,-6.751
3D body: height 0.45, standoff -0.05, extent 14.753,-7.249 15.25,-6.751
3D body: height 0.45, standoff -0.05, extent 15.753,-7.249 16.25,-6.751
3D body: height 0.45, standoff -0.05, extent 16.753,-7.249 17.25,-6.751
3D body: height 0.45, standoff -0.05, extent 17.753,-7.249 18.25,-6.751
3D body: height 0.45, standoff -0.05, extent 18.753,-7.249 19.25,-6.751
3D body: height 0.45, standoff -0.05, extent 19.753,-7.249 20.25,-6.751
3D body: height 0.45, standoff -0.05, extent 20.753,-7.249 21.25,-6.751
3D body: height 0.45, standoff -0.05, extent 9.753,-6.249 10.25,-5.751
3D body: height 0.45, standoff -0.05, extent 8.753,-6.249 9.25,-5.751
3D body: height 0.45, standoff -0.05, extent 7.753,-6.249 8.25,-5.751
3D body: height 0.45, standoff -0.05, extent 6.753,-6.249 7.25,-5.751
3D body: height 0.45, standoff -0.05, extent 5.753,-6.249 6.25,-5.751
3D body: height 0.45, standoff -0.05, extent 4.753,-6.249 5.25,-5.751
3D body: height 0.45, standoff -0.05, extent 3.753,-6.249 4.25,-5.751
3D body: height 0.45, standoff -0.05, extent 2.753,-6.249 3.25,-5.751
3D body: height 0.45, standoff -0.05, extent 1.753,-6.249 2.25,-5.751
3D body: height 0.45, standoff -0.05, extent 0.753,-6.249 1.25,-5.751
3D body: height 0.45, standoff -0.05, extent -0.247,-6.249 0.25,-5.751
3D body: height 0.45, standoff -0.05, extent 10.753,-6.249 11.25,-5.751
3D body: height 0.45, standoff -0.05, extent 11.753,-6.249 12.25,-5.751
3D body: height 0.45, standoff -0.05, extent 12.753,-6.249 13.25,-5.751
3D body: height 0.45, standoff -0.05, extent 13.753,-6.249 14.25,-5.751
3D body: height 0.45, standoff -0.05, extent 14.753,-6.249 15.25,-5.751
3D body: height 0.45, standoff -0.05, extent 15.753,-6.249 16.25,-5.751
3D body: height 0.45, standoff -0.05, extent 16.753,-6.249 17.25,-5.751
3D body: height 0.45, standoff -0.05, extent 17.753,-6.249 18.25,-5.751
3D body: height 0.45, standoff -0.05, extent 18.753,-6.249 19.25,-5.751
3D body: height 0.45, standoff -0.05, extent 19.753,-6.249 20.25,-5.751
3D body: height 0.45, standoff -0.05, extent 20.753,-6.249 21.25,-5.751
3D body: height 0.45, standoff -0.05, extent 9.753,-5.249 10.25,-4.751
3D body: height 0.45, standoff -0.05, extent 8.753,-5.249 9.25,-4.751
3D body: height 0.45, standoff -0.05, extent 7.753,-5.249 8.25,-4.751
3D body: height 0.45, standoff -0.05, extent 6.753,-5.249 7.25,-4.751
3D body: height 0.45, standoff -0.05, extent 5.753,-5.249 6.25,-4.751
3D body: height 0.45, standoff -0.05, extent 4.753,-5.249 5.25,-4.751
3D body: height 0.45, standoff -0.05, extent 3.753,-5.249 4.25,-4.751
3D body: height 0.45, standoff -0.05, extent 2.753,-5.249 3.25,-4.751
3D body: height 0.45, standoff -0.05, extent 1.753,-5.249 2.25,-4.751
3D body: height 0.45, standoff -0.05, extent 0.753,-5.249 1.25,-4.751
3D body: height 0.45, standoff -0.05, extent -0.247,-5.249 0.25,-4.751
3D body: height 0.45, standoff -0.05, extent 10.753,-5.249 11.25,-4.751
3D body: height 0.45, standoff -0.05, extent 11.753,-5.249 12.25,-4.751
3D body: height 0.45, standoff -0.05, extent 12.753,-5.249 13.25,-4.751
3D body: height 0.45, standoff -0.05, extent 13.753,-5.249 14.25,-4.751
3D body: height 0.45, standoff -0.05, extent 14.753,-5.249 15.25,-4.751
3D body: height 0.45, standoff -0.05, extent 15.753,-5.249 16.25,-4.751
3D body: height 0.45, standoff -0.05, extent 16.753,-5.249 17.25,-4.751
3D body: height 0.45, standoff -0.05, extent 17.753,-5.249 18.25,-4.751
3D body: height 0.45, standoff -0.05, extent 18.753,-5.249 19.25,-4.751
3D body: height 0.45, standoff -0.05, extent 19.753,-5.249 20.25,-4.751
3D body: height 0.45, standoff -0.05, extent 20.753,-5.249 21.25,-4.751
3D body: height 0.45, standoff -0.05, extent 9.753,-4.249 10.25,-3.751
3D body: height 0.45, standoff -0.05, extent 8.753,-4.249 9.25,-3.751
3D body: height 0.45, standoff -0.05, extent 7.753,-4.249 8.25,-3.751
3D body: height 0.45, standoff -0.05, extent 6.753,-4.249 7.25,-3.751
3D body: height 0.45, standoff -0.05, extent 5.753,-4.249 6.25,-3.751
3D body: height 0.45, standoff -0.05, extent 4.753,-4.249 5.25,-3.751
3D body: height 0.45, standoff -0.05, extent 3.753,-4.249 4.25,-3.751
3D body: height 0.45, standoff -0.05, extent 2.753,-4.249 3.25,-3.751
3D body: height 0.45, standoff -0.05, extent 1.753,-4.249 2.25,-3.751
3D body: height 0.45, standoff -0.05, extent 0.753,-4.249 1.25,-3.751
3D body: height 0.45, standoff -0.05, extent -0.247,-4.249 0.25,-3.751
3D body: height 0.45, standoff -0.05, extent 10.753,-4.249 11.25,-3.751
3D body: height 0.45, standoff -0.05, extent 11.753,-4.249 12.25,-3.751
3D body: height 0.45, standoff -0.05, extent 12.753,-4.249 13.25,-3.751
3D body: height 0.45, standoff -0.05, extent 13.753,-4.249 14.25,-3.751
3D body: height 0.45, standoff -0.05, extent 14.753,-4.249 15.25,-3.751
3D body: height 0.45, standoff -0.05, extent 15.753,-4.249 16.25,-3.751
3D body: height 0.45, standoff -0.05, extent 16.753,-4.249 17.25,-3.751
3D body: height 0.45, standoff -0.05, extent 17.753,-4.249 18.25,-3.751
3D body: height 0.45, standoff -0.05, extent 18.753,-4.249 19.25,-3.751
3D body: height 0.45, standoff -0.05, extent 19.753,-4.249 20.25,-3.751
3D body: height 0.45, standoff -0.05, extent 20.753,-4.249 21.25,-3.751
3D body: height 0.45, standoff -0.05, extent 9.753,-3.249 10.25,-2.751
3D body: height 0.45, standoff -0.05, extent 8.753,-3.249 9.25,-2.751
3D body: height 0.45, standoff -0.05, extent 7.753,-3.249 8.25,-2.751
3D body: height 0.45, standoff -0.05, extent 6.753,-3.249 7.25,-2.751
3D body: height 0.45, standoff -0.05, extent 5.753,-3.249 6.25,-2.751
3D body: height 0.45, standoff -0.05, extent 4.753,-3.249 5.25,-2.751
3D body: height 0.45, standoff -0.05, extent 3.753,-3.249 4.25,-2.751
3D body: height 0.45, standoff -0.05, extent 2.753,-3.249 3.25,-2.751
3D body: height 0.45, standoff -0.05, extent 1.753,-3.249 2.25,-2.751
3D body: height 0.45, standoff -0.05, extent 0.753,-3.249 1.25,-2.751
3D body: height 0.45, standoff -0.05, extent -0.247,-3.249 0.25,-2.751
3D body: height 0.45, standoff -0.05, extent 10.753,-3.249 11.25,-2.751
3D body: height 0.45, standoff -0.05, extent 11.753,-3.249 12.25,-2.751
3D body: height 0.45, standoff -0.05, extent 12.753,-3.249 13.25,-2.751
3D body: height 0.45, standoff -0.05, extent 13.753,-3.249 14.25,-2.751
3D body: height 0.45, standoff -0.05, extent 14.753,-3.249 15.25,-2.751
3D body: height 0.45, standoff -0.05, extent 15.753,-3.249 16.25,-2.751
3D body: height 0.45, standoff -0.05, extent 16.753,-3.249 17.25,-2.751
3D body: height 0.45, standoff -0.05, extent 17.753,-3.249 18.25,-2.751
3D body: height 0.45, standoff -0.05, extent 18.753,-3.249 19.25,-2.751
3D body: height 0.45, standoff -0.05, extent 19.753,-3.249 20.25,-2.751
3D body: height 0.45, standoff -0.05, extent 20.753,-3.249 21.25,-2.751
3D body: height 0.45, standoff -0.05, extent 9.753,-2.249 10.25,-1.751
3D body: height 0.45, standoff -0.05, extent 8.753,-2.249 9.25,-1.751
3D body: height 0.45, standoff -0.05, extent 7.753,-2.249 8.25,-1.751
3D body: height 0.45, standoff -0.05, extent 6.753,-2.249 7.25,-1.751
3D body: height 0.45, standoff -0.05, extent 5.753,-2.249 6.25,-1.751
3D body: height 0.45, standoff -0.05, extent 4.753,-2.249 5.25,-1.751
3D body: height 0.45, standoff -0.05, extent 3.753,-2.249 4.25,-1.751
3D body: height 0.45, standoff -0.05, extent 2.753,-2.249 3.25,-1.751
3D body: height 0.45, standoff -0.05, extent 1.753,-2.249 2.25,-1.751
3D body: height 0.45, standoff -0.05, extent 0.753,-2.249 1.25,-1.751
3D body: height 0.45, standoff -0.05, extent -0.247,-2.249 0.25,-1.751
3D body: height 0.45, standoff -0.05, extent 10.753,-2.249 11.25,-1.751
3D body: height 0.45, standoff -0.05, extent 11.753,-2.249 12.25,-1.751
3D body: height 0.45, standoff -0.05, extent 12.753,-2.249 13.25,-1.751
3D body: height 0.45, standoff -0.05, extent 13.753,-2.249 14.25,-1.751
3D body: height 0.45, standoff -0.05, extent 14.753,-2.249 15.25,-1.751
3D body: height 0.45, standoff -0.05, extent 15.753,-2.249 16.25,-1.751
3D body: height 0.45, standoff -0.05, extent 16.753,-2.249 17.25,-1.751
3D body: height 0.45, standoff -0.05, extent 17.753,-2.249 18.25,-1.751
3D body: height 0.45, standoff -0.05, extent 18.753,-2.249 19.25,-1.751
3D body: height 0.45, standoff -0.05, extent 19.753,-2.249 20.25,-1.751
3D body: height 0.45, standoff -0.05, extent 20.753,-2.249 21.25,-1.751
3D body: height 0.45, standoff -0.05, extent 9.753,-1.249 10.25,-0.751
3D body: height 0.45, standoff -0.05, extent 8.753,-1.249 9.25,-0.751
3D body: height 0.45, standoff -0.05, extent 7.753,-1.249 8.25,-0.751
3D body: height 0.45, standoff -0.05, extent 6.753,-1.249 7.25,-0.751
3D body: height 0.45, standoff -0.05, extent 5.753,-1.249 6.25,-0.751
3D body: height 0.45, standoff -0.05, extent 4.753,-1.249 5.25,-0.751
3D body: height 0.45, standoff -0.05, extent 3.753,-1.249 4.25,-0.751
3D body: height 0.45, standoff -0.05, extent 2.753,-1.249 3.25,-0.751
3D body: height 0.45, standoff -0.05, extent 1.753,-1.249 2.25,-0.751
3D body: height 0.45, standoff -0.05, extent 0.753,-1.249 1.25,-0.751
3D body: height 0.45, standoff -0.05, extent -0.247,-1.249 0.25,-0.751
3D body: height 0.45, standoff -0.05, extent 10.753,-1.249 11.25,-0.751
3D body: height 0.45, standoff -0.05, extent 11.753,-1.249 12.25,-0.751
3D body: height 0.45, standoff -0.05, extent 12.753,-1.249 13.25,-0.751
3D body: height 0.45, standoff -0.05, extent 13.753,-1.249 14.25,-0.751
3D body: height 0.45, standoff -0.05, extent 14.753,-1.249 15.25,-0.751
3D body: height 0.45, standoff -0.05, extent 15.753,-1.249 16.25,-0.751
3D body: height 0.45, standoff -0.05, extent 16.753,-1.249 17.25,-0.751
3D body: height 0.45, standoff -0.05, extent 17.753,-1.249 18.25,-0.751
3D body: height 0.45, standoff -0.05, extent 18.753,-1.249 19.25,-0.751
3D body: height 0.45, standoff -0.05, extent 19.753,-1.249 20.25,-0.751
3D body: height 0.45, standoff -0.05, extent 20.753,-1.249 21.25,-0.751
3D body: height 0.45, standoff -0.05, extent 20.753,-0.249 21.25,0.249
3D body: height 0.45, standoff -0.05, extent 19.753,-0.249 20.25,0.249
3D body: height 0.45, standoff -0.05, extent 18.753,-0.249 19.25,0.249
3D body: height 0.45, standoff -0.05, extent 17.753,-0.249 18.25,0.249
3D body: height 0.45, standoff -0.05, extent 16.753,-0.249 17.25,0.249
3D body: height 0.45, standoff -0.05, extent 15.753,-0.249 16.25,0.249
3D body: height 0.45, standoff -0.05, extent 14.753,-0.249 15.25,0.249
3D body: height 0.45, standoff -0.05, extent 13.753,-0.249 14.25,0.249
3D body: height 0.45, standoff -0.05, extent 12.753,-0.249 13.25,0.249
3D body: height 0.45, standoff -0.05, extent 11.753,-0.249 12.25,0.249
3D body: height 0.45, standoff -0.05, extent 10.753,-0.249 11.25,0.249
3D body: height 0.45, standoff -0.05, extent -0.247,-0.249 0.25,0.249
3D body: height 0.45, standoff -0.05, extent 0.753,-0.249 1.25,0.249
3D body: height 0.45, standoff -0.05, extent 1.753,-0.249 2.25,0.249
3D body: height 0.45, standoff -0.05, extent 2.753,-0.249 3.25,0.249
3D body: height 0.45, standoff -0.05, extent 3.753,-0.249 4.25,0.249
3D body: height 0.45, standoff -0.05, extent 4.753,-0.249 5.25,0.249
3D body: height 0.45, standoff -0.05, extent 5.753,-0.249 6.25,0.249
3D body: height 0.45, standoff -0.05, extent 6.753,-0.249 7.25,0.249
3D body: height 0.45, standoff -0.05, extent 7.753,-0.249 8.25,0.249
3D body: height 0.45, standoff -0.05, extent 8.753,-0.249 9.25,0.249
3D body: height 0.45, standoff -0.05, extent 9.753,-0.249 10.25,0.249
3D body: height 2.16, standoff 2.1, extent 1.45,-18 19.5,-3